# Altium footprint library ACTION_IC.PcbLib: 137 footprints (part 2 of 9)
Each footprint in its own frame and in the unit in brackets; x right, y up, seen from the top. Pads: shape width x height; smd on the part's side, far side on the other; paste and mask are expansions set on the pad; w line width, h text height; cw(c..) or ccw(c..) is an arc to the next point about the centre after c.
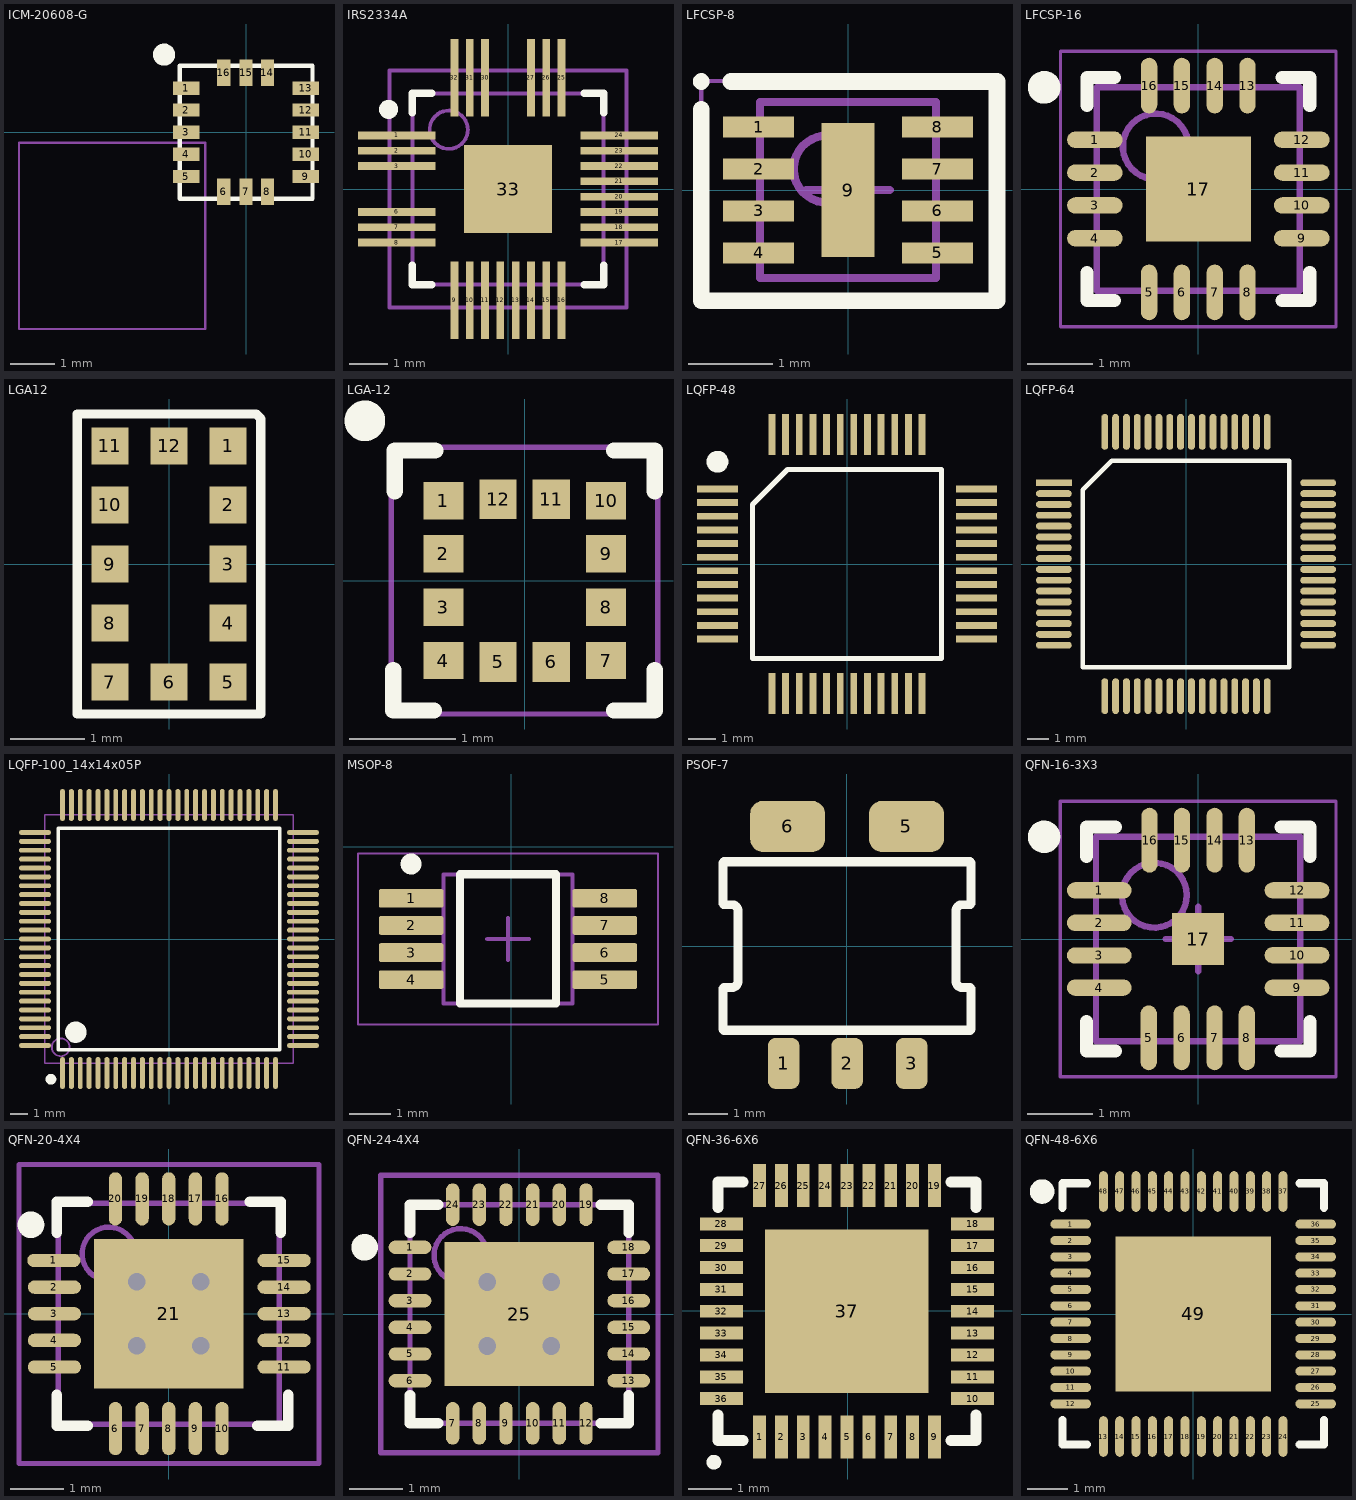
[diagram p1: the footprints below, top view; thin cyan lines are the x and y axes]

## ICM-20608-G [mm] "ICM-20608-G"
height 0.86
pads (16):
  rect 0.6x0.3 smd: 1(-1.346,0.991) 2(-1.346,0.5) 3(-1.346,0) 4(-1.346,-0.5) 5(-1.346,-1) 9(1.346,-1) 10(1.346,-0.5) 11(1.346,0) 12(1.346,0.5) 13(1.346,0.991)
  rect 0.3x0.6 smd: 6(-0.5,-1.346) 7(0,-1.346) 8(0.483,-1.346) 14(0.483,1.346) 15(0,1.346) 16(-0.5,1.346)
Top Overlay:
  circle w0.25: c-1.85,1.75 r0.125
  lines w0.1: -1.5,-1.5 1.5,-1.5 1.5,1.5 -1.5,1.5 -1.5,-1.5
Mechanical 20:
  lines w0.05: -5.123,-4.437 -5.123,-0.237 -0.923,-0.237 -0.923,-4.437 -5.123,-4.437
3D body "ICM-20602.stp": height 0.8, standoff 0, extent -1.55,-1.576 1.55,1.524

## IRS2334A [mm] "irs2334"
height 1
pads (29):
  rect 2.032x0.2 smd: 1(-2.906,1.4) 2(-2.906,1) 3(-2.906,0.6) 6(-2.906,-0.6) 7(-2.906,-1) 8(-2.906,-1.4) 17(2.906,-1.4) 18(2.906,-1) 19(2.906,-0.6) 20(2.906,-0.2) 21(2.906,0.2) 22(2.906,0.6) 23(2.906,1) 24(2.906,1.4)
  rect 0.2x2.032 smd: 9(-1.4,-2.906) 10(-1,-2.906) 11(-0.6,-2.906) 12(-0.2,-2.906) 13(0.2,-2.906) 14(0.6,-2.906) 15(1,-2.906) 16(1.4,-2.906) 25(1.4,2.906) 26(1,2.906) 27(0.6,2.906) 30(-0.6,2.906) 31(-1,2.906) 32(-1.4,2.906)
  rect 2.3x2.3 smd: 33(0,0)
Top Overlay:
  circle w0.25: c-3.122,2.083 r0.125
  lines w0.2: -2.5,-2 -2.5,-2.5 -2,-2.5 ; -2.5,2 -2.5,2.5 -2,2.5 ; 2,-2.5 2.5,-2.5 2.5,-2 ; 2,2.5 2.5,2.5 2.5,2
Mechanical 13:
  circle w0.1: c-1.55,1.55 r0.5
  lines w0.1: -2.5,-2.5 2.5,-2.5 2.5,2.5 -2.5,2.5 -2.5,-2.5
Mechanical 15:
  lines w0.1: -0.5,0 0.5,0 ; 0,-0.5 0,0.5 ; -3.1,-3.1 3.1,-3.1 3.1,3.1 -3.1,3.1 -3.1,-3.1
3D body: height 1, standoff 0.02, extent -2.5,-2.5 2.5,2.5

## LFCSP-8 [mm]
height 0.6
pads (9):
  rect 0.85x0.25 smd: 1(-1.067,0.75) 2(-1.067,0.25) 3(-1.067,-0.25) 4(-1.067,-0.75) 5(1.067,-0.75) 6(1.067,-0.25) 7(1.067,0.25) 8(1.067,0.75)
  rect 0.63x1.6 smd: 9(0,0)
Top Overlay:
  circle w0.1: c-1.753,1.295 r0.05
  lines w0.2: -1.753,0.965 -1.753,-1.321 1.778,-1.321 1.778,1.295 -1.397,1.295
Mechanical 13:
  circle w0.1: c-0.25,0.25 r0.4
  lines w0.1: -1.05,-1.05 -1.05,1.05 1.05,1.05 1.05,-1.05 -1.05,-1.05
Mechanical 15:
  lines w0.05: -1.753,-1.3 -1.753,1.3 1.778,1.3 1.778,-1.3 -1.753,-1.3
  lines w0.1: -0.5,0 0.5,0 ; 0,-0.5 0,0.5
3D body: height 0.6, standoff 0.05, extent -1.05,-1.05 1.05,1.05

## LFCSP-16 [mm]
height 0.8
pads (17):
  oval 0.85x0.25 smd: 1(-1.577,0.75) 2(-1.577,0.25) 3(-1.577,-0.25) 4(-1.577,-0.75) 9(1.577,-0.75) 10(1.577,-0.25) 11(1.577,0.25) 12(1.577,0.75)
  oval 0.25x0.85 smd: 5(-0.75,-1.577) 6(-0.25,-1.577) 7(0.25,-1.577) 8(0.75,-1.577) 13(0.75,1.577) 14(0.25,1.577) 15(-0.25,1.577) 16(-0.75,1.577)
  rect 1.6x1.6 smd: 17(0,0)
Top Overlay:
  circle w0.25: c-2.35,1.55 r0.125
  lines w0.2: -1.7,-1.275 -1.7,-1.7 -1.275,-1.7 ; -1.7,1.275 -1.7,1.7 -1.275,1.7 ; 1.275,-1.7 1.7,-1.7 1.7,-1.275 ; 1.275,1.7 1.7,1.7 1.7,1.275
Mechanical 13:
  circle w0.1: c-0.65,0.65 r0.5
  lines w0.1: -1.55,-1.55 1.55,-1.55 1.55,1.55 -1.55,1.55 -1.55,-1.55
Mechanical 15:
  lines w0.05: -2.1,-2.1 2.1,-2.1 2.1,2.1 -2.1,2.1 -2.1,-2.1
  lines w0.1: -0.5,0 0.5,0 ; 0,-0.5 0,0.5
3D body "LFCSP-16.step": height 0.8, standoff 0, extent -1.57,-1.57 1.57,1.57

## LGA12 [mm]
pads (12):
  rect 0.5x0.5 smd: 1(0.8,1.6) 2(0.8,0.8) 3(0.8,0) 4(0.8,-0.8) 5(0.8,-1.6) 6(0,-1.6) 7(-0.8,-1.6) 8(-0.8,-0.8) 9(-0.8,0) 10(-0.8,0.8) 11(-0.8,1.6) 12(0,1.6)
Top Overlay:
  lines w0.127: -1.245,-2.032 -1.245,2.032 1.181,2.032 1.245,1.968 1.245,-2.032 -1.245,-2.032
3D body: height 1.05, standoff 0, extent -1.168,-1.956 1.143,1.956

## LGA-12 [mm]
pads (12):
  rect 0.375x0.35 smd: 1(-0.763,0.75) 2(-0.763,0.25) 3(-0.763,-0.25) 4(-0.763,-0.75) 7(0.763,-0.75) 8(0.763,-0.25) 9(0.763,0.25) 10(0.763,0.75)
  rect 0.35x0.375 smd: 5(-0.25,-0.762) 6(0.25,-0.762) 11(0.25,0.763) 12(-0.25,0.763)
Top Overlay:
  circle w0.254: c-1.499,1.499 r0.064
  lines w0.152: -1.232,-0.838 -1.232,-1.219 -0.851,-1.219 ; -1.219,0.838 -1.219,1.219 -0.838,1.219 ; 0.838,-1.219 1.219,-1.219 1.219,-0.838 ; 0.838,1.219 1.219,1.219 1.219,0.838
Mechanical 3:
  lines w0.05: -1.25,-1.251 1.249,-1.251 1.249,1.251 -1.25,1.251 -1.25,-1.251
3D body "User Library-lga-2x2x0_9.STEP": height 0.95, standoff 0, extent -1,-1 1,1

## LQFP-48 [mm]
pads (48):
  rect 1.5x0.25 smd: 1(-4.75,2.75) 2(-4.75,2.25) 3(-4.75,1.75) 4(-4.75,1.25) 5(-4.75,0.75) 6(-4.75,0.25) 7(-4.75,-0.25) 8(-4.75,-0.75) 9(-4.75,-1.25) 10(-4.75,-1.75) 11(-4.75,-2.25) 12(-4.75,-2.75) 25(4.75,-2.75) 26(4.75,-2.25) 27(4.75,-1.75) 28(4.75,-1.25) 29(4.75,-0.75) 30(4.75,-0.25) 31(4.75,0.25) 32(4.75,0.75) 33(4.75,1.25) 34(4.75,1.75) 35(4.75,2.25) 36(4.75,2.75)
  rect 0.25x1.5 smd: 13(-2.75,-4.75) 14(-2.25,-4.75) 15(-1.75,-4.75) 16(-1.25,-4.75) 17(-0.75,-4.75) 18(-0.25,-4.75) 19(0.25,-4.75) 20(0.75,-4.75) 21(1.25,-4.75) 22(1.75,-4.75) 23(2.25,-4.75) 24(2.75,-4.75) 37(2.75,4.75) 38(2.25,4.75) 39(1.75,4.75) 40(1.25,4.75) 41(0.75,4.75) 42(0.25,4.75) 43(-0.25,4.75) 44(-0.75,4.75) 45(-1.25,4.75) 46(-1.75,4.75) 47(-2.25,4.75) 48(-2.75,4.75)
Top Overlay:
  circle w0.4: c-4.75,3.75 r0.2
  lines w0.2: -3.465,-3.465 -3.465,2.18 -2.18,3.465 3.465,3.465 3.465,-3.465 -3.465,-3.465
3D body "LQFP7X7-48.STEP": height 1.56, standoff 0, extent -4.525,-4.48 4.474,4.52

## LQFP-64 [mm]
pads (64):
  rect 1.651x0.32 smd: 1(-6.1,3.75)
  oval 1.651x0.32 smd: 2(-6.1,3.25) 3(-6.1,2.75) 4(-6.1,2.25) 5(-6.1,1.75) 6(-6.1,1.25) 7(-6.1,0.75) 8(-6.1,0.25) 9(-6.1,-0.25) 10(-6.1,-0.75) 11(-6.1,-1.25) 12(-6.1,-1.75) 13(-6.1,-2.25) 14(-6.1,-2.75) 15(-6.1,-3.25) 16(-6.1,-3.75) 33(6.1,-3.75) 34(6.1,-3.25) 35(6.1,-2.75) 36(6.1,-2.25) 37(6.1,-1.75) 38(6.1,-1.25) 39(6.1,-0.75) 40(6.1,-0.25) 41(6.1,0.25) 42(6.1,0.75) 43(6.1,1.25) 44(6.1,1.75) 45(6.1,2.25) 46(6.1,2.75) 47(6.1,3.25) 48(6.1,3.75)
  oval 0.32x1.651 smd: 17(-3.75,-6.1) 18(-3.25,-6.1) 19(-2.75,-6.1) 20(-2.25,-6.1) 21(-1.75,-6.1) 22(-1.25,-6.1) 23(-0.75,-6.1) 24(-0.25,-6.1) 25(0.25,-6.1) 26(0.75,-6.1) 27(1.25,-6.1) 28(1.75,-6.1) 29(2.25,-6.1) 30(2.75,-6.1) 31(3.25,-6.1) 32(3.75,-6.1) 49(3.75,6.1) 50(3.25,6.1) 51(2.75,6.1) 52(2.25,6.1) 53(1.75,6.1) 54(1.25,6.1) 55(0.75,6.1) 56(0.25,6.1) 57(-0.25,6.1) 58(-0.75,6.1) 59(-1.25,6.1) 60(-1.75,6.1) 61(-2.25,6.1) 62(-2.75,6.1) 63(-3.25,6.1) 64(-3.75,6.1)
Top Overlay:
  lines w0.2: -4.765,-4.765 4.765,-4.765 4.765,4.765 -3.43,4.765 -4.765,3.43 -4.765,-4.765
3D body "LQFP-64.STEP": height 1.6, standoff 0, extent -5.949,-6 6.051,6

## LQFP-100_14x14x05P [mm]
pads (100):
  oval 0.28x1.8 smd mask+0.051: 1(-6,-7.55) 2(-5.5,-7.55) 3(-5,-7.55) 4(-4.5,-7.55) 5(-4,-7.55) 6(-3.5,-7.55) 7(-3,-7.55) 8(-2.5,-7.55) 9(-2,-7.55) 10(-1.5,-7.55) 11(-1,-7.55) 12(-0.5,-7.55) 13(0,-7.55) 14(0.5,-7.55) 15(1,-7.55) 16(1.5,-7.55) 17(2,-7.55) 18(2.5,-7.55) 19(3,-7.55) 20(3.5,-7.55) 21(4,-7.55) 22(4.5,-7.55) 23(5,-7.55) 24(5.5,-7.55) 25(6,-7.55) 51(6,7.55) 52(5.5,7.55) 53(5,7.55) 54(4.5,7.55) 55(4,7.55) 56(3.5,7.55) 57(3,7.55) 58(2.5,7.55) 59(2,7.55) 60(1.5,7.55) 61(1,7.55) 62(0.5,7.55) 63(0,7.55) 64(-0.5,7.55) 65(-1,7.55) 66(-1.5,7.55) 67(-2,7.55) 68(-2.5,7.55) 69(-3,7.55) 70(-3.5,7.55) 71(-4,7.55) 72(-4.5,7.55) 73(-5,7.55) 74(-5.5,7.55) 75(-6,7.55)
  oval 1.8x0.28 smd mask+0.051: 26(7.55,-6) 27(7.55,-5.5) 28(7.55,-5) 29(7.55,-4.5) 30(7.55,-4) 31(7.55,-3.5) 32(7.55,-3) 33(7.55,-2.5) 34(7.55,-2) 35(7.55,-1.5) 36(7.55,-1) 37(7.55,-0.5) 38(7.55,0) 39(7.55,0.5) 40(7.55,1) 41(7.55,1.5) 42(7.55,2) 43(7.55,2.5) 44(7.55,3) 45(7.55,3.5) 46(7.55,4) 47(7.55,4.5) 48(7.55,5) 49(7.55,5.5) 50(7.55,6) 76(-7.55,6) 77(-7.55,5.5) 78(-7.55,5) 79(-7.55,4.5) 80(-7.55,4) 81(-7.55,3.5) 82(-7.55,3) 83(-7.55,2.5) 84(-7.55,2) 85(-7.55,1.5) 86(-7.55,1) 87(-7.55,0.5) 88(-7.55,0) 89(-7.55,-0.5) 90(-7.55,-1) 91(-7.55,-1.5) 92(-7.55,-2) 93(-7.55,-2.5) 94(-7.55,-3) 95(-7.55,-3.5) 96(-7.55,-4) 97(-7.55,-4.5) 98(-7.55,-5) 99(-7.55,-5.5) 100(-7.55,-6)
Top Overlay:
  circle w0.3: c-6.65,-7.9 r0.15
  circle w0.6: c-5.25,-5.25 r0.3
  lines w0.2: -6.25,-6.25 6.25,-6.25 6.25,6.25 -6.25,6.25 -6.25,-6.25
Mechanical 13:
  circle w0.1: c-6.1,-6.1 r0.5
  lines w0.1: -7,-7 7,-7 7,7 -7,7 -7,-7
3D body "User Library-LQFP100_Grid_0_5.STEP": height 1.6, standoff 0, extent -8,-8 8,8

## MSOP-8 [mm]
pads (8):
  rrect22% 1.55x0.45 smd: 1(-2.401,-1.235) 2(-2.401,-1.885) 3(-2.401,-2.535) 4(-2.401,-3.185) 5(2.249,-3.185) 6(2.249,-2.535) 7(2.249,-1.885) 8(2.249,-1.235)
Top Overlay:
  circle w0.25: c-2.401,-0.41 r0.125
  lines w0.2: -1.226,-3.76 1.074,-3.76 1.074,-0.66 -1.226,-0.66 -1.226,-3.76
Mechanical 13:
  lines w0.1: -1.626,-3.76 1.474,-3.76 1.474,-0.66 -1.626,-0.66 -1.626,-3.76
Mechanical 15:
  lines w0.05: -3.676,-4.26 3.524,-4.26 3.524,-0.16 -3.676,-0.16 -3.676,-4.26
  lines w0.1: -0.576,-2.21 0.424,-2.21 ; -0.076,-2.71 -0.076,-1.71
3D body "MUY08A_ASM.stp": height 0.94, standoff -0.02, extent -2.527,-3.708 2.375,-0.711

## PSOF-7 [mm]
pads (5):
  rrect50% 0.8x1.3 smd: 1(-1.6,-2.972) 2(0.013,-2.972) 3(1.651,-2.972)
  rrect50% 1.9x1.3 smd: 5(1.52,3.048) 6(-1.5,3.048)
Top Overlay:
  lines w0.127: -3.09,-2.073 3.11,-2.073 ; -3.09,2.09 3.11,2.09 ; -3.19,-1.996 -3.19,-2.094 ccw(c-3.091,-2.093) -3.09,-2.192 ; -3.19,-1.996 -3.19,-1.091 ; -3.19,-1.996 -3.09,-1.996 ; -3.19,-1.091 cw(c-3.09,-1.091) -3.09,-0.991 ; -3.19,-1.091 -3.09,-1.091 ; -3.19,1.109 ccw(c-3.09,1.109) -3.09,1.009 ; -3.19,1.109 -3.19,2.014 ; -3.19,1.109 -3.09,1.109 ; -3.19,2.014 -3.19,2.112 cw(c-3.091,2.111) -3.09,2.21 ; -3.19,2.014 -3.09,2.014 ; -3.09,-2.192 -3.09,-1.996 ; -3.09,-2.192 3.11,-2.192 ; -3.09,-1.996 -3.09,-1.091 ; -3.09,-1.091 -2.91,-1.091 ; -3.09,-1.091 -3.09,-0.991 ; -3.09,-0.991 -2.91,-0.991 ; -3.09,1.009 -2.91,1.009 ; -3.09,1.009 -3.09,1.109 ; -3.09,1.109 -2.91,1.109 ; -3.09,1.109 -3.09,2.014 ; -3.09,2.014 -3.09,2.21 ; -3.09,2.21 3.11,2.21 ; -2.91,-1.091 ccw(c-2.909,-0.893) -2.71,-0.891 ; -2.91,-1.091 -2.91,-0.991 ; -2.91,-0.991 ccw(c-2.91,-0.891) -2.81,-0.891 ; -2.91,1.009 cw(c-2.91,0.909) -2.81,0.909 ; -2.91,1.009 -2.91,1.109 ; -2.91,1.109 cw(c-2.909,0.91) -2.71,0.909 ; -2.81,-0.891 -2.81,0.909 ; -2.81,-0.891 -2.71,-0.891 ; -2.81,0.909 -2.71,0.909 ; -2.71,-0.891 -2.71,0.909 ; 2.73,-0.891 ccw(c2.929,-0.893) 2.93,-1.091 ; 2.73,-0.891 2.73,0.909 ; 2.73,-0.891 2.83,-0.891 ; 2.73,0.909 cw(c2.929,0.91) 2.93,1.109 ; 2.73,0.909 2.83,0.909 ; 2.83,-0.891 ccw(c2.93,-0.891) 2.93,-0.991 ; 2.83,-0.891 2.83,0.909 ; 2.83,0.909 cw(c2.93,0.909) 2.93,1.009 ; 2.93,-1.091 3.11,-1.091 ; 2.93,-1.091 2.93,-0.991 ; 2.93,-0.991 3.11,-0.991 ; 2.93,1.009 3.11,1.009 ; 2.93,1.009 2.93,1.109 ; 2.93,1.109 3.11,1.109 ; 3.11,-2.192 ccw(c3.111,-2.093) 3.21,-2.094 3.21,-1.996 ; 3.11,-2.192 3.11,-1.996 ; 3.11,-1.996 3.11,-1.091 ; 3.11,-1.996 3.21,-1.996 ; 3.11,-1.091 3.11,-0.991 ; 3.11,-1.091 3.21,-1.091 ; 3.11,-0.991 cw(c3.11,-1.091) 3.21,-1.091 ; 3.11,1.009 ccw(c3.11,1.109) 3.21,1.109 ; 3.11,1.009 3.11,1.109 ; 3.11,1.109 3.11,2.014 ; 3.11,1.109 3.21,1.109 ; 3.11,2.014 3.21,2.014 ; 3.11,2.014 3.11,2.21 ; 3.11,2.21 cw(c3.111,2.111) 3.21,2.112 3.21,2.014 ; 3.21,-1.996 3.21,-1.091 ; 3.21,1.109 3.21,2.014
3D body "User Library-7-Pin PSOF Package.STEP": height 1.64, standoff 0.16, extent -3.175,-3.15 3.225,3.25

## QFN-16-3X3 [mm]
height 0.8
pads (17):
  oval 1x0.25 smd: 1(-1.524,0.75) 2(-1.524,0.25) 3(-1.524,-0.254) 4(-1.524,-0.75) 9(1.524,-0.75) 10(1.524,-0.25) 11(1.524,0.25) 12(1.524,0.75)
  oval 0.25x1 smd: 5(-0.762,-1.524) 6(-0.254,-1.524) 7(0.254,-1.524) 8(0.75,-1.524) 13(0.75,1.524) 14(0.254,1.524) 15(-0.25,1.524) 16(-0.75,1.524)
  rect 0.8x0.8 smd: 17(0,0)
Top Overlay:
  circle w0.25: c-2.375,1.575 r0.125
  lines w0.2: -1.725,-1.275 -1.725,-1.725 -1.275,-1.725 ; -1.725,1.275 -1.725,1.725 -1.275,1.725 ; 1.275,-1.725 1.725,-1.725 1.725,-1.275 ; 1.275,1.725 1.725,1.725 1.725,1.275
Mechanical 13:
  circle w0.1: c-0.675,0.675 r0.5
  lines w0.1: -1.575,-1.575 -1.575,1.575 1.575,1.575 1.575,-1.575 -1.575,-1.575
Mechanical 15:
  lines w0.05: -2.125,-2.125 -2.125,2.125 2.125,2.125 2.125,-2.125 -2.125,-2.125
  lines w0.1: -0.5,0 0.5,0 ; 0,-0.5 0,0.5
3D body: height 0.8, standoff 0.05, extent -1.575,-1.575 1.575,1.575

## QFN-20-4X4 [mm]
pads (21):
  oval 1x0.25 smd: 1(-2.155,1) 2(-2.145,0.5) 3(-2.145,0) 4(-2.145,-0.5) 5(-2.145,-1) 11(2.165,-1) 12(2.165,-0.5) 13(2.165,0) 14(2.165,0.5) 15(2.165,1)
  oval 0.25x1 smd: 6(-1,-2.155) 7(-0.5,-2.155) 8(0,-2.155) 9(0.5,-2.155) 10(1,-2.155) 16(1,2.155) 17(0.5,2.155) 18(0,2.155) 19(-0.5,2.155) 20(-1,2.155)
  rect 2.8x2.8 smd: 21(0,0)
via -0.6,0.6 diameter 0.66 hole 0.33
via 0.6,0.6 diameter 0.66 hole 0.33
via -0.6,-0.6 diameter 0.66 hole 0.33
via 0.6,-0.6 diameter 0.66 hole 0.33
Top Overlay:
  circle w0.25: c-2.585,1.67 r0.125
  lines w0.2: -2.1,-1.525 -2.1,-2.1 -1.525,-2.1 ; -2.1,1.525 -2.1,2.1 -1.525,2.1 ; 1.525,2.1 2.1,2.1 2.1,1.525 ; 1.665,-2.1 2.24,-2.1 2.24,-1.525
Mechanical 13:
  circle w0.1: c-1.125,1.125 r0.5
  lines w0.1: -2.075,-2.075 -2.075,2.075 2.075,2.075 2.075,-2.075 -2.075,-2.075
Mechanical 15:
  lines w0.1: -0.5,0 0.5,0 ; 0,-0.5 0,0.5 ; -2.81,-2.81 -2.81,2.8 2.82,2.8 2.82,-2.81 -2.81,-2.81
3D body "User Library-QFN20(4x4).STEP": height 0.9, standoff -0.02, extent -2,-2 2,2

## QFN-24-4X4 [mm]
pads (25):
  oval 0.8x0.25 smd: 1(-2.05,1.25) 2(-2.05,0.75) 3(-2.05,0.25) 4(-2.05,-0.25) 5(-2.05,-0.75) 6(-2.05,-1.25) 13(2.05,-1.25) 14(2.05,-0.75) 15(2.05,-0.25) 16(2.05,0.25) 17(2.05,0.75) 18(2.05,1.25)
  oval 0.25x0.8 smd: 7(-1.25,-2.05) 8(-0.75,-2.05) 9(-0.25,-2.05) 10(0.25,-2.05) 11(0.75,-2.05) 12(1.25,-2.05) 19(1.25,2.05) 20(0.75,2.05) 21(0.25,2.05) 22(-0.25,2.05) 23(-0.75,2.05) 24(-1.25,2.05)
  rect 2.8x2.7 smd: 25(0,0)
via 0.6,-0.6 diameter 0.66 hole 0.33
via -0.6,-0.6 diameter 0.66 hole 0.33
via 0.6,0.6 diameter 0.66 hole 0.33
via -0.6,0.6 diameter 0.66 hole 0.33
Top Overlay:
  circle w0.25: c-2.9,1.25 r0.125
  lines w0.2: -2.05,-1.525 -2.05,-2.05 -1.525,-2.05 ; -2.05,1.525 -2.05,2.05 -1.525,2.05 ; 1.525,-2.05 2.05,-2.05 2.05,-1.525 ; 1.525,2.05 2.05,2.05 2.05,1.525
Mechanical 13:
  circle w0.1: c-1.1,1.1 r0.5
  lines w0.1: -2.05,-2.05 2.05,-2.05 2.05,2.05 -2.05,2.05 -2.05,-2.05
Mechanical 15:
  lines w0.1: -0.5,0 0.5,0 ; 0,-0.5 0,0.5 ; -2.6,-2.6 2.6,-2.6 2.6,2.6 -2.6,2.6 -2.6,-2.6
3D body "MLF24.STEP": height 1, standoff 0, extent -2,-1.981 2,2.019

## QFN-36-6X6 [mm]
pads (37):
  rect 0.3x1 smd: 1(-2.048,-2.935) 2(-1.54,-2.934) 3(-1.032,-2.934) 4(-0.524,-2.934) 5(-0.016,-2.934) 6(0.492,-2.934) 7(1,-2.934) 8(1.508,-2.934) 9(2.016,-2.934) 19(2.016,2.907) 20(1.508,2.907) 21(1,2.907) 22(0.492,2.907) 23(-0.016,2.907) 24(-0.524,2.907) 25(-1.032,2.907) 26(-1.54,2.907) 27(-2.048,2.908)
  rect 1x0.3 smd: 10(2.905,-2.046) 11(2.905,-1.538) 12(2.905,-1.03) 13(2.905,-0.522) 14(2.905,-0.014) 15(2.905,0.494) 16(2.905,1.002) 17(2.905,1.51) 18(2.905,2.018) 28(-2.937,2.018) 29(-2.938,1.51) 30(-2.937,1.002) 31(-2.937,0.494) 32(-2.937,-0.014) 33(-2.937,-0.522) 34(-2.937,-1.03) 35(-2.937,-1.538) 36(-2.937,-2.046)
  rect 3.8x3.8 smd: 37(-0.017,-0.013)
Top Overlay:
  circle w0.254: c-3.11,-3.52 r0.044
  lines w0.254: -3.017,-2.427 -3.017,-3.013 -2.43,-3.013 ; -3.017,2.399 -3.017,2.986 -2.43,2.986 ; 2.397,-3.013 2.983,-3.013 2.983,-2.427 ; 2.397,2.986 2.983,2.986 2.983,2.399
3D body "User Library-QFN36 (6x6).step": height 0.9, standoff 0.01, extent -3.102,-3.102 3.103,3.103

## QFN-48-6X6 [mm]
pads (49):
  oval 0.994x0.22 smd: 1(-3,2.201) 2(-3,1.8) 3(-3,1.401) 4(-3,0.999) 5(-3,0.601) 6(-3,0.199) 7(-3,-0.199) 8(-3,-0.601) 9(-3,-0.999) 10(-3,-1.401) 11(-3,-1.8) 12(-3,-2.201) 25(3,-2.201) 26(3,-1.8) 27(3,-1.401) 28(3,-0.999) 29(3,-0.601) 30(3,-0.199) 31(3,0.199) 32(3,0.601) 33(3,0.999) 34(3,1.401) 35(3,1.8) 36(3,2.201)
  oval 0.22x0.994 smd: 13(-2.198,-3) 14(-1.8,-3) 15(-1.401,-3) 16(-0.999,-3) 17(-0.601,-3) 18(-0.199,-3) 19(0.199,-3) 20(0.601,-3) 21(0.999,-3) 22(1.401,-3) 23(1.8,-3) 24(2.201,-3) 37(2.201,3) 38(1.8,3) 39(1.401,3) 40(0.999,3) 41(0.601,3) 42(0.199,3) 43(-0.199,3) 44(-0.601,3) 45(-0.999,3) 46(-1.401,3) 47(-1.8,3) 48(-2.198,3)
  rect 3.8x3.8 smd: 49(0.001,0.001)
Top Overlay:
  lines w0.2: -3.2,-2.6 -3.2,-3.2 -2.6,-3.2 ; -3.2,2.6 -3.2,3.2 -2.6,3.2 ; 2.6,-3.2 3.2,-3.2 3.2,-2.6 ; 2.6,3.2 3.2,3.2 3.2,2.6
  lines w0.3: -3.55,2.998 cw(c-3.7,3) -3.55,3.001
3D body "User Library-QFN48_0_4.STEP": height 0.9, standoff -0.01, extent -2.999,-2.999 3.001,3.001